# Altium footprint library ConnectorsTDH.PcbLib: 194 footprints (part 10 of 13)
Each footprint in its own frame and in the unit in brackets; x right, y up, seen from the top. Pads: shape width x height; smd on the part's side, far side on the other; paste and mask are expansions set on the pad; w line width, h text height; cw(c..) or ccw(c..) is an arc to the next point about the centre after c.
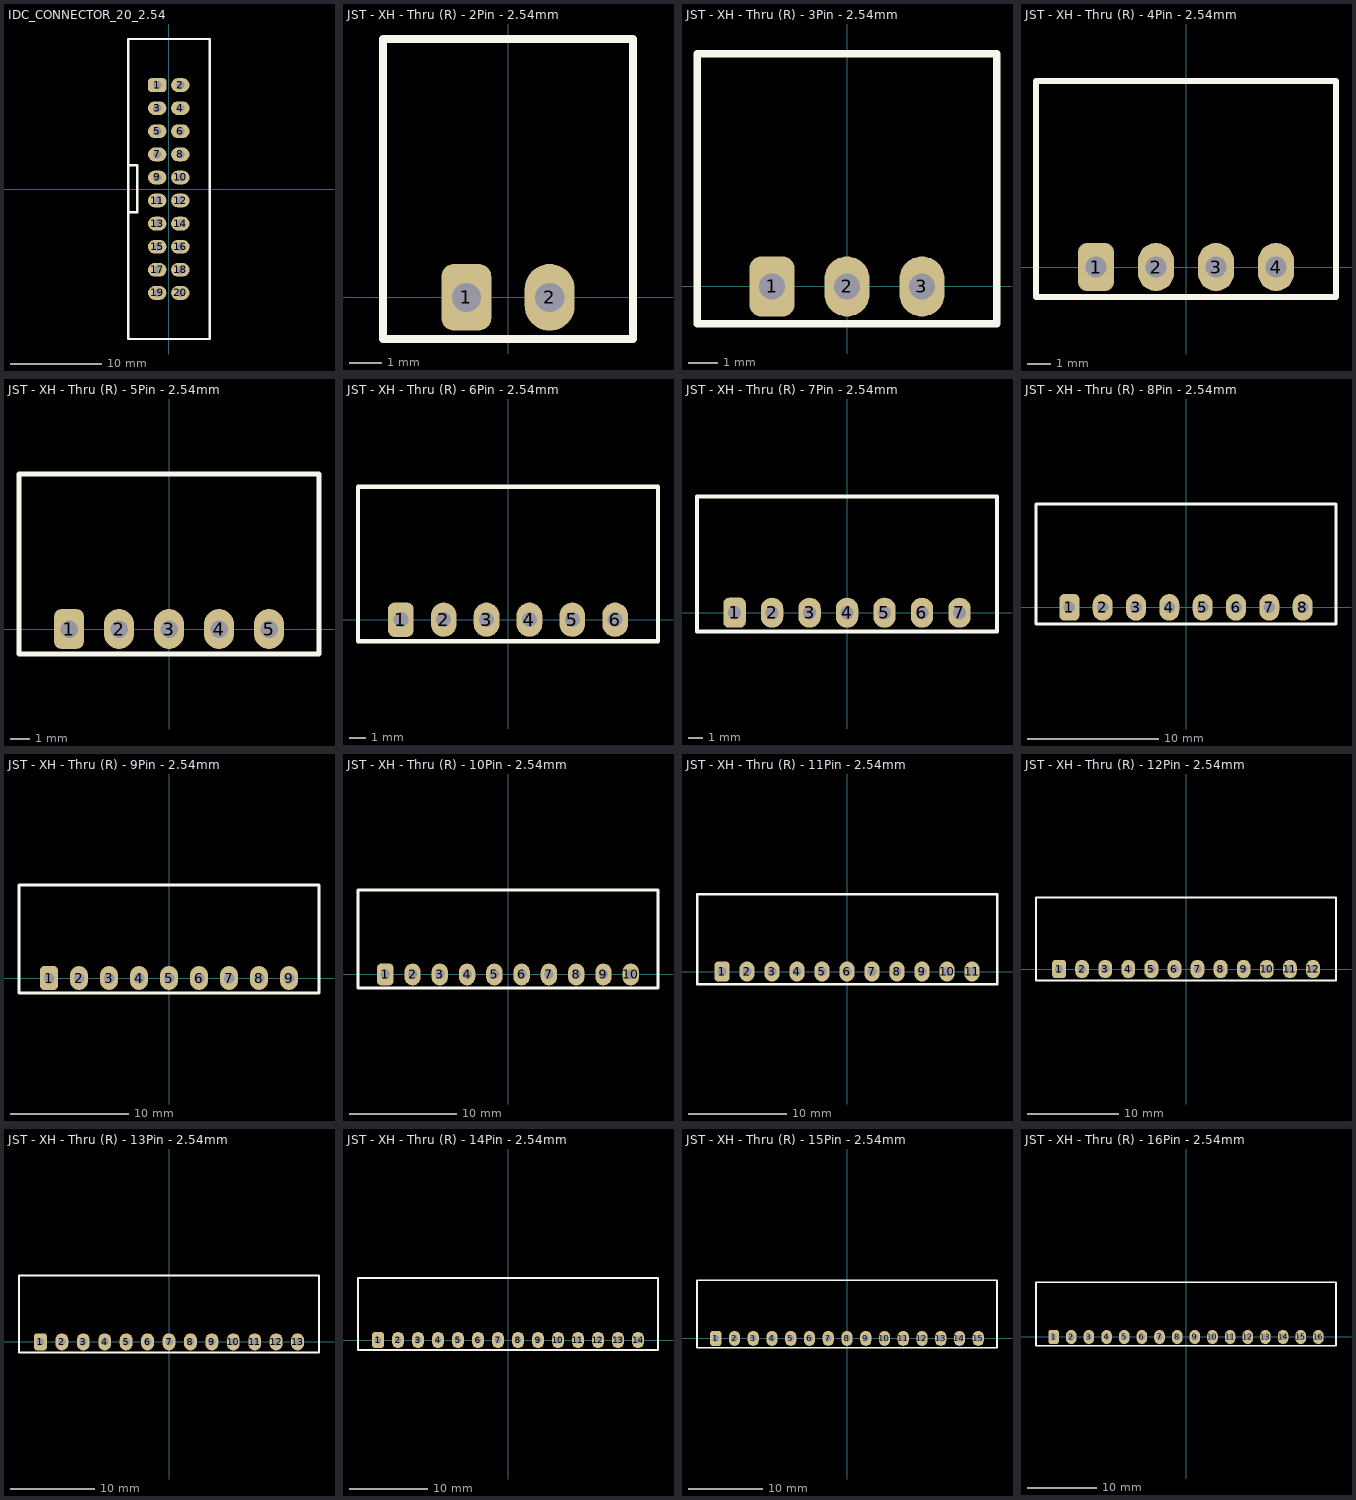
[diagram p9: the footprints below, top view; thin cyan lines are the x and y axes]

## IDC_CONNECTOR_20_2.54 [mil]
pads (20):
  rrect50% 80x60 hole 35: 1(-50,450)
  oval 80x60 hole 35: 2(50,450) 3(-50,350) 4(50,350) 5(-50,250) 6(50,250) 7(-50,150) 8(50,150) 9(-50,50) 10(50,50) 11(-50,-50) 12(50,-50) 13(-50,-150) 14(50,-150) 15(-50,-250) 16(50,-250) 17(-50,-350) 18(50,-350) 19(-50,-450) 20(50,-450)
Top Overlay:
  lines w10: -169.29,-100.39 -136.81,-100.39 -136.81,103.35 -169.29,103.35 ; -175.2,-649.61 177.17,-649.61 177.17,649.61 -175.2,649.61 -175.2,-649.61
3D body "DS1013-20S (IDC-20MS CONNFLY).stp": height 354.33, standoff -141.73, extent -176.18,-653.54 174.21,653.54

## JST - XH - Thru (R) - 2Pin - 2.54mm [mil]
pads (2):
  rrect50% 60x80 hole 35: 1(-50,0)
  oval 60x80 hole 35: 2(50,0)
Top Overlay:
  lines w10: -150,-50 150,-50 150,310 -150,310 -150,-50
3D body "JST - XH - Thru (R) - 2Pin - 2.54mm.stp": height 230, standoff -133, extent -142,-12.79 142,303.6

## JST - XH - Thru (R) - 3Pin - 2.54mm [mil]
pads (3):
  rrect50% 60x80 hole 35: 1(-100,0)
  oval 60x80 hole 35: 2(0,0) 3(100,0)
Top Overlay:
  lines w10: -200,-50 -200,310 200,310 200,-50 -190,-50 -200,-50
3D body "JST - XH - Thru (R) - 3Pin - 2.54mm.stp": height 230, standoff -133, extent -192,-12.79 192,303.6

## JST - XH - Thru (R) - 4Pin - 2.54mm [mil]
pads (4):
  rrect50% 60x80 hole 35: 1(-150,0)
  oval 60x80 hole 35: 2(-50,0) 3(50,0) 4(150,0)
Top Overlay:
  lines w10: -250,-50 -250,310 250,310 250,-50 -250,-50
3D body "JST - XH - Thru (R) - 4Pin - 2.54mm.stp": height 230, standoff -133, extent -242,-12.79 242,303.6

## JST - XH - Thru (R) - 5Pin - 2.54mm [mil]
pads (5):
  rrect50% 60x80 hole 35: 1(-200,0)
  oval 60x80 hole 35: 2(-100,0) 3(0,0) 4(100,0) 5(200,0)
Top Overlay:
  lines w10: -300,-50 -300,310 300,310 300,-50 -300,-50
3D body "JST - XH - Thru (R) - 5Pin - 2.54mm.stp": height 230, standoff -133, extent -292,-12.79 292,303.6

## JST - XH - Thru (R) - 6Pin - 2.54mm [mil]
pads (6):
  rrect50% 60x80 hole 35: 1(-250,0)
  oval 60x80 hole 35: 2(-150,0) 3(-50,0) 4(50,0) 5(150,0) 6(250,0)
Top Overlay:
  lines w10: -350,-50 -350,310 350,310 350,-50 -350,-50
3D body "JST - XH - Thru (R) - 6Pin - 2.54mm.stp": height 230, standoff -133, extent -342,-12.79 342,303.6

## JST - XH - Thru (R) - 7Pin - 2.54mm [mil]
pads (7):
  rrect50% 60x80 hole 35: 1(-300,0)
  oval 60x80 hole 35: 2(-200,0) 3(-100,0) 4(0,0) 5(100,0) 6(200,0) 7(300,0)
Top Overlay:
  lines w10: -400,-50 -400,310 400,310 400,-50 -400,-50
3D body "JST - XH - Thru (R) - 7Pin - 2.54mm.stp": height 230, standoff -133, extent -392,-12.79 392,303.6

## JST - XH - Thru (R) - 8Pin - 2.54mm [mil]
pads (8):
  rrect50% 60x80 hole 35: 1(-350,0)
  oval 60x80 hole 35: 2(-250,0) 3(-150,0) 4(-50,0) 5(50,0) 6(150,0) 7(250,0) 8(350,0)
Top Overlay:
  lines w10: -450,-50 -450,310 450,310 450,-50 -450,-50
3D body "JST - XH - Thru (R) - 8Pin - 2.54mm.stp": height 230, standoff -133, extent -442,-12.79 442,303.6

## JST - XH - Thru (R) - 9Pin - 2.54mm [mil]
pads (9):
  rrect50% 60x80 hole 35: 1(-400,0)
  oval 60x80 hole 35: 2(-300,0) 3(-200,0) 4(-100,0) 5(0,0) 6(100,0) 7(200,0) 8(300,0) 9(400,0)
Top Overlay:
  lines w10: -500,-50 -500,310 500,310 500,-50 -500,-50
3D body "JST - XH - Thru (R) - 9Pin - 2.54mm.stp": height 230, standoff -133, extent -492,-12.79 492,303.6

## JST - XH - Thru (R) - 10Pin - 2.54mm [mil]
pads (10):
  rrect50% 60x80 hole 35: 1(-450,0)
  oval 60x80 hole 35: 2(-350,0) 3(-250,0) 4(-150,0) 5(-50,0) 6(50,0) 7(150,0) 8(250,0) 9(350,0) 10(450,0)
Top Overlay:
  lines w10: -550,-50 -550,310 550,310 550,-50 -550,-50
3D body "JST - XH - Thru (R) - 10Pin - 2.54mm.stp": height 230, standoff -133, extent -542,-12.79 542,303.6

## JST - XH - Thru (R) - 11Pin - 2.54mm [mil]
pads (11):
  rrect50% 60x80 hole 35: 1(-500,0)
  oval 60x80 hole 35: 2(-400,0) 3(-300,0) 4(-200,0) 5(-100,0) 6(0,0) 7(100,0) 8(200,0) 9(300,0) 10(400,0) 11(500,0)
Top Overlay:
  lines w10: -600,-50 -600,310 600,310 600,-50 -600,-50
3D body "JST - XH - Thru (R) - 11Pin - 2.54mm.stp": height 230, standoff -133, extent -592,-12.79 592,303.6

## JST - XH - Thru (R) - 12Pin - 2.54mm [mil]
pads (12):
  rrect50% 60x80 hole 35: 1(-550,0)
  oval 60x80 hole 35: 2(-450,0) 3(-350,0) 4(-250,0) 5(-150,0) 6(-50,0) 7(50,0) 8(150,0) 9(250,0) 10(350,0) 11(450,0) 12(550,0)
Top Overlay:
  lines w10: -650,-50 -650,310 650,310 650,-50 -650,-50
3D body "JST - XH - Thru (R) - 12Pin - 2.54mm.stp": height 230, standoff -133, extent -642,-12.79 642,303.6

## JST - XH - Thru (R) - 13Pin - 2.54mm [mil]
pads (13):
  rrect50% 60x80 hole 35: 1(-600,0)
  oval 60x80 hole 35: 2(-500,0) 3(-400,0) 4(-300,0) 5(-200,0) 6(-100,0) 7(0,0) 8(100,0) 9(200,0) 10(300,0) 11(400,0) 12(500,0) 13(600,0)
Top Overlay:
  lines w10: -700,-50 700,-50 700,310 -700,310 -700,-50
3D body "JST - XH - Thru (R) - 13Pin - 2.54mm.stp": height 230, standoff -133, extent -692,-12.79 692,303.6

## JST - XH - Thru (R) - 14Pin - 2.54mm [mil]
pads (14):
  rrect50% 60x80 hole 35: 1(-650,0)
  oval 60x80 hole 35: 2(-550,0) 3(-450,0) 4(-350,0) 5(-250,0) 6(-150,0) 7(-50,0) 8(50,0) 9(150,0) 10(250,0) 11(350,0) 12(450,0) 13(550,0) 14(650,0)
Top Overlay:
  lines w10: -750,-50 -750,310 750,310 750,-50 -750,-50
3D body "JST - XH - Thru (R) - 14Pin - 2.54mm.stp": height 230, standoff -133, extent -742,-12.79 742,303.6

## JST - XH - Thru (R) - 15Pin - 2.54mm [mil]
pads (15):
  rrect50% 60x80 hole 35: 1(-700,0)
  oval 60x80 hole 35: 2(-600,0) 3(-500,0) 4(-400,0) 5(-300,0) 6(-200,0) 7(-100,0) 8(0,0) 9(100,0) 10(200,0) 11(300,0) 12(400,0) 13(500,0) 14(600,0) 15(700,0)
Top Overlay:
  lines w10: -800,-50 800,-50 800,310 -800,310 -800,-50
3D body "JST - XH - Thru (R) - 15Pin - 2.54mm.stp": height 230, standoff -133, extent -792,-12.79 792,303.6

## JST - XH - Thru (R) - 16Pin - 2.54mm [mil]
pads (16):
  rrect50% 60x80 hole 35: 1(-750,0)
  oval 60x80 hole 35: 2(-650,0) 3(-550,0) 4(-450,0) 5(-350,0) 6(-250,0) 7(-150,0) 8(-50,0) 9(50,0) 10(150,0) 11(250,0) 12(350,0) 13(450,0) 14(550,0) 15(650,0) 16(750,0)
Top Overlay:
  lines w10: -850,-50 850,-50 850,310 -850,310 -850,-50
3D body "JST - XH - Thru (R) - 16Pin - 2.54mm.stp": height 230, standoff -133, extent -842,-12.79 842,303.6